# Altium footprint library XU-GENARAL PCB .PcbLib: 1176 footprints (part 47 of 75)
Each footprint in its own frame and in the unit in brackets; x right, y up, seen from the top. Pads: shape width x height; smd on the part's side, far side on the other; paste and mask are expansions set on the pad; w line width, h text height; cw(c..) or ccw(c..) is an arc to the next point about the centre after c.
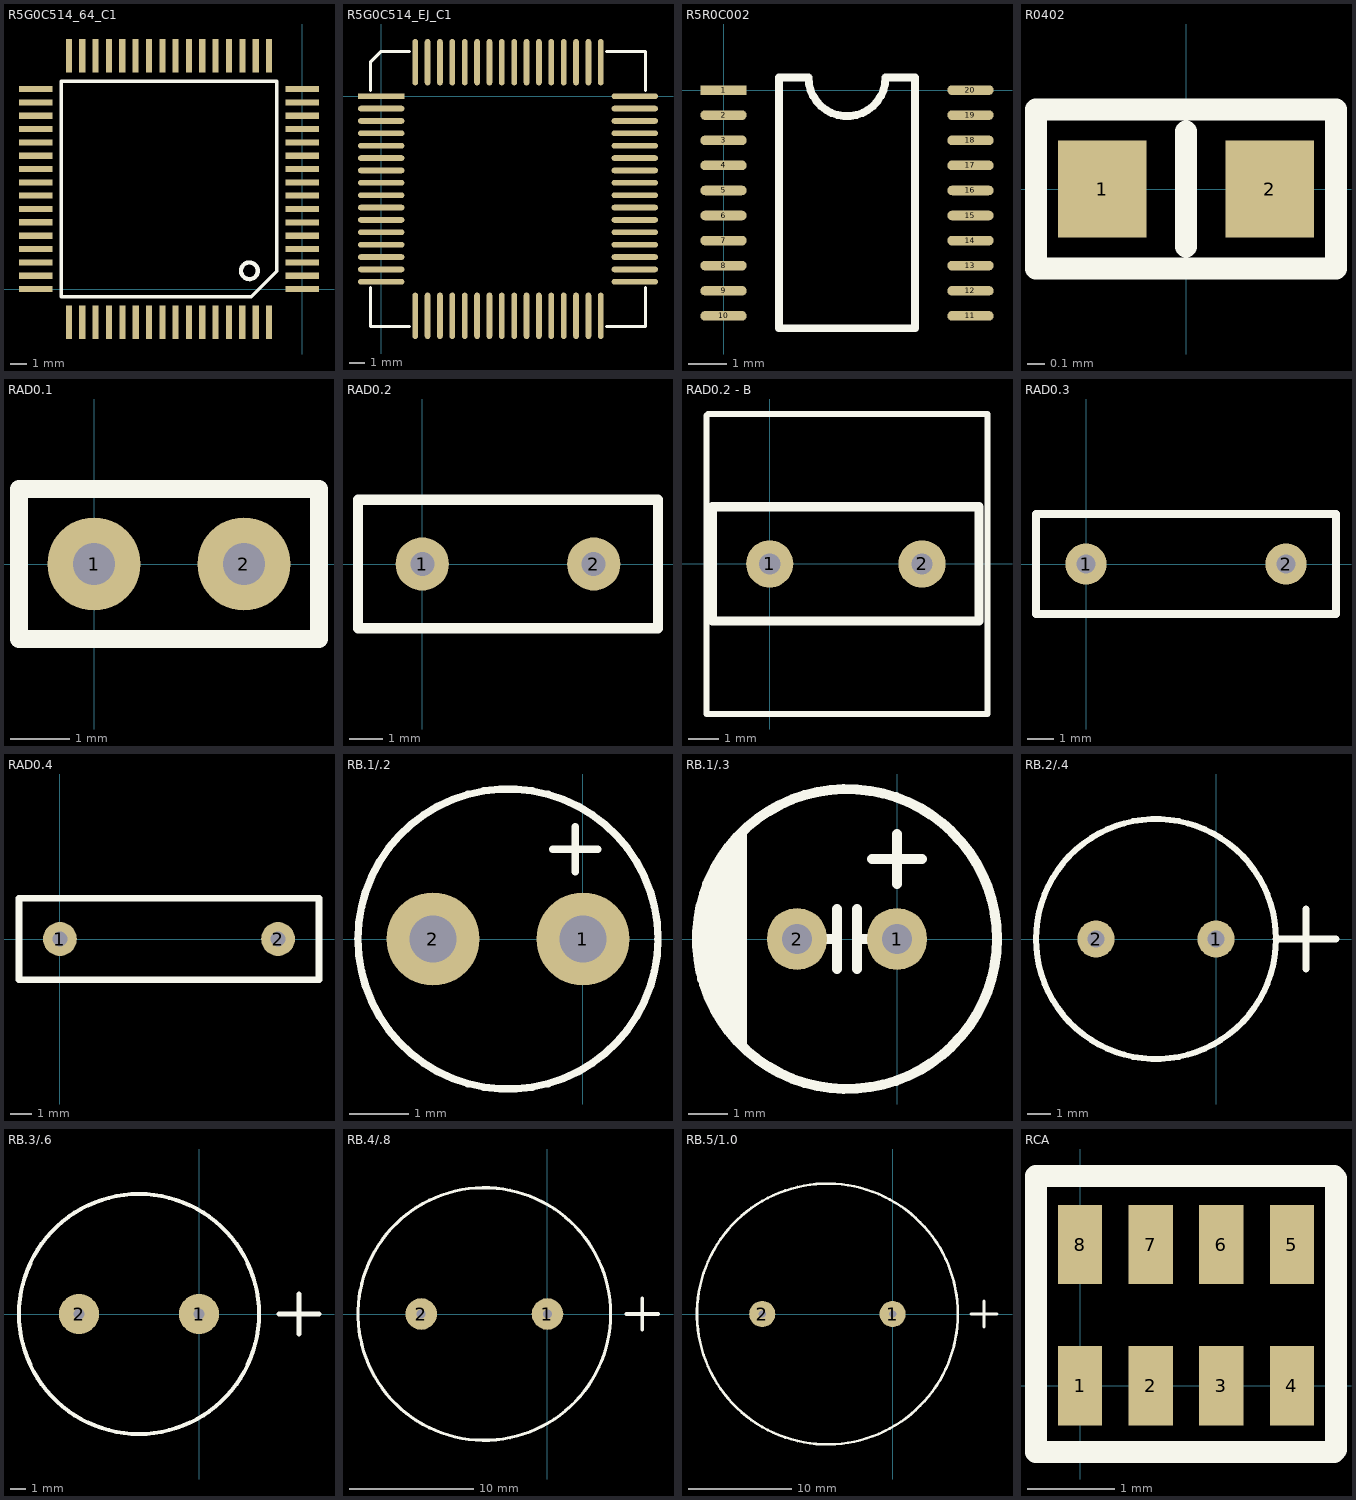
[diagram p46: the footprints below, top view; thin cyan lines are the x and y axes]

## R5G0C514_64_C1 [mm]
pads (64):
  rect 2x0.37 smd: 1(0,0) 2(0,0.8) 3(0,1.6) 4(0,2.4) 5(0,3.2) 6(0,4) 7(0,4.8) 8(0,5.6) 9(0,6.4) 10(0,7.2) 11(0,8) 12(0,8.8) 13(0,9.6) 14(0,10.4) 15(0,11.2) 16(0,12) 33(-16,12) 34(-16,11.2) 35(-16,10.4) 36(-16,9.6) 37(-16,8.8) 38(-16,8) 39(-16,7.2) 40(-16,6.4) 41(-16,5.6) 42(-16,4.8) 43(-16,4) 44(-16,3.2) 45(-16,2.4) 46(-16,1.6) 47(-16,0.8) 48(-16,0)
  rect 0.37x2 smd: 17(-2,14) 18(-2.8,14) 19(-3.6,14) 20(-4.4,14) 21(-5.2,14) 22(-6,14) 23(-6.8,14) 24(-7.6,14) 25(-8.4,14) 26(-9.2,14) 27(-10,14) 28(-10.8,14) 29(-11.6,14) 30(-12.4,14) 31(-13.2,14) 32(-14,14) 49(-14,-2) 50(-13.2,-2) 51(-12.4,-2) 52(-11.6,-2) 53(-10.8,-2) 54(-10,-2) 55(-9.2,-2) 56(-8.4,-2) 57(-7.6,-2) 58(-6.8,-2) 59(-6,-2) 60(-5.2,-2) 61(-4.4,-2) 62(-3.6,-2) 63(-2.8,-2) 64(-2,-2)
Top Overlay:
  circle w0.254: c-3.175,1.092 r0.501
  lines w0.2: -14.465,-0.465 -3.07,-0.465 -1.535,1.07 -1.535,12.465 -14.465,12.465 -14.465,-0.465

## R5G0C514_EJ_C1 [mm]
pads (64):
  rect 3x0.37 smd: 1(0,0)
  oval 3x0.37 smd: 2(0,-0.8) 3(0,-1.6) 4(0,-2.4) 5(0,-3.2) 6(0,-4) 7(0,-4.8) 8(0,-5.6) 9(0,-6.4) 10(0,-7.2) 11(0,-8) 12(0,-8.8) 13(0,-9.6) 14(0,-10.4) 15(0,-11.2) 16(0,-12) 33(16.4,-12) 34(16.4,-11.2) 35(16.4,-10.4) 36(16.4,-9.6) 37(16.4,-8.8) 38(16.4,-8) 39(16.4,-7.2) 40(16.4,-6.4) 41(16.4,-5.6) 42(16.4,-4.8) 43(16.4,-4) 44(16.4,-3.2) 45(16.4,-2.4) 46(16.4,-1.6) 47(16.4,-0.8) 48(16.4,0)
  oval 0.37x3 smd: 17(2.2,-14.2) 18(3,-14.2) 19(3.8,-14.2) 20(4.6,-14.2) 21(5.4,-14.2) 22(6.2,-14.2) 23(7,-14.2) 24(7.8,-14.2) 25(8.6,-14.2) 26(9.4,-14.2) 27(10.2,-14.2) 28(11,-14.2) 29(11.8,-14.2) 30(12.6,-14.2) 31(13.4,-14.2) 32(14.2,-14.2) 49(14.2,2.2) 50(13.4,2.2) 51(12.6,2.2) 52(11.8,2.2) 53(11,2.2) 54(10.2,2.2) 55(9.4,2.2) 56(8.6,2.2) 57(7.8,2.2) 58(7,2.2) 59(6.2,2.2) 60(5.4,2.2) 61(4.6,2.2) 62(3.8,2.2) 63(3,2.2) 64(2.2,2.2)
Top Overlay:
  lines w0.2: -0.7,-12.37 -0.7,-14.9 1.83,-14.9 ; -0.7,0.37 -0.7,2.2 0,2.9 1.83,2.9 ; 14.57,-14.9 17.1,-14.9 17.1,-12.37 ; 14.57,2.9 17.1,2.9 17.1,0.37

## R5R0C002 [mm]
pads (20):
  rect 1.2x0.25 smd: 1(0,0)
  oval 1.2x0.25 smd: 2(0,-0.65) 3(0,-1.3) 4(0,-1.95) 5(0,-2.6) 6(0,-3.25) 7(0,-3.9) 8(0,-4.55) 9(0,-5.2) 10(0,-5.85) 11(6.4,-5.85) 12(6.4,-5.2) 13(6.4,-4.55) 14(6.4,-3.9) 15(6.4,-3.25) 16(6.4,-2.6) 17(6.4,-1.95) 18(6.4,-1.3) 19(6.4,-0.65) 20(6.4,0)
Top Overlay:
  lines w0.2: 1.435,-6.175 4.965,-6.175 4.965,0.325 4.2,0.325 cw(c3.2,0.325) 2.2,0.325 1.435,0.325 1.435,-6.175

## R0402 [mil]
pads (2):
  rect 20x22 smd: 1(-19,0) 2(19,0)
Top Overlay:
  lines w5: 0,-13 0,13 ; -34,-18 -34,18 34,18 34,-18 -34,-18

## RAD0.1 [mil]
pads (2):
  round 62 hole 28: 1(0,0) 2(100,0)
Top Overlay:
  lines w12: -50,-50 150,-50 150,50 -50,50 -50,-50

## RAD0.2 [mil]
pads (2):
  round 62 hole 28: 1(0,0) 2(200,0)
Top Overlay:
  lines w12: -75,-75 -75,75 275,75 275,-75 -75,-75

## RAD0.2 - B [mil]
pads (2):
  round 62 hole 28: 1(0,0) 2(200,0)
Top Overlay:
  lines w8: 0,196.85 285.79,196.85 285.79,-197 -82.79,-197 -82.79,194.85 -80.79,196.85 2,196.85
  lines w12: -75,-75 275,-75 275,75 -75,75 -75,-75

## RAD0.3 [mil]
pads (2):
  round 62 hole 28: 1(0,0) 2(300,0)
Top Overlay:
  lines w12: -75,-75 -75,75 375,75 375,-75 -75,-75

## RAD0.4 [mil]
pads (2):
  round 62 hole 28: 1(0,0) 2(400,0)
Top Overlay:
  lines w12: -75,-75 475,-75 475,75 -75,75 -75,-75

## RB.1/.2 [mil]
pads (2):
  round 62 hole 31.5: 1(0,0) 2(-100,0)
Top Overlay:
  circle w5: c-50,0 r100
  lines w5: -20,60 10,60 ; -5,45 -5,75

## RB.1/.3 [mil]
pads (2):
  oval 60x62 hole 30: 1(0,0) 2(-100,0)
Top Overlay:
  circle w10: c-50,0 r150
  lines w10: -195,-40 -195,35 ; -190,-50 -190,55 ; -185,-65 -185,65 ; -180,-70 -180,75 ; -175,-80 -175,80 ; -165,-95 -165,95 ; -155,-105 -155,105 ; -70,0 -60,0 ; -60,-30 -60,30 ; -40,-30 -40,30 ; -40,0 -30,0 ; -25,80 25,80 ; 0,55 0,105

## RB.2/.4 [mil]
pads (2):
  round 62 hole 28: 1(0,0) 2(-200,0)
Top Overlay:
  circle w10: c-100,0 r200
  lines w12: 100,0 200,0 ; 150,-50 150,50

## RB.3/.6 [mil]
pads (2):
  round 100 hole 28: 1(0,0) 2(-300,0)
Top Overlay:
  circle w10: c-150,0 r300
  lines w12: 200,0 300,0 ; 250,-50 250,50

## RB.4/.8 [mil]
pads (2):
  round 100 hole 28: 1(0,0) 2(-400,0)
Top Overlay:
  circle w10: c-200,0 r400
  lines w12: 250,0 350,0 ; 300,-50 300,50

## RB.5/1.0 [mil]
pads (2):
  round 100 hole 28: 1(0,0) 2(-500,0)
Top Overlay:
  circle w10: c-250,0 r500
  lines w12: 300,0 400,0 ; 350,-50 350,50

## RCA [mil]
pads (8):
  rect 20x36 smd: 1(0,0) 2(32,0) 3(64,0) 4(96,0) 5(96,64) 6(64,64) 7(32,64) 8(0,64)
Top Overlay:
  lines w10: -20,-30 115,-30 116,-29 116,-23 116,87 116,94 115,95 -20,95 -20,87 -20,-23 -20,-30 ; -20,-30 -20,-30